# Altium footprint library Connector.PcbLib: 82 footprints (part 4 of 6)
Each footprint in its own frame and in the unit in brackets; x right, y up, seen from the top. Pads: shape width x height; smd on the part's side, far side on the other; paste and mask are expansions set on the pad; w line width, h text height; cw(c..) or ccw(c..) is an arc to the next point about the centre after c.
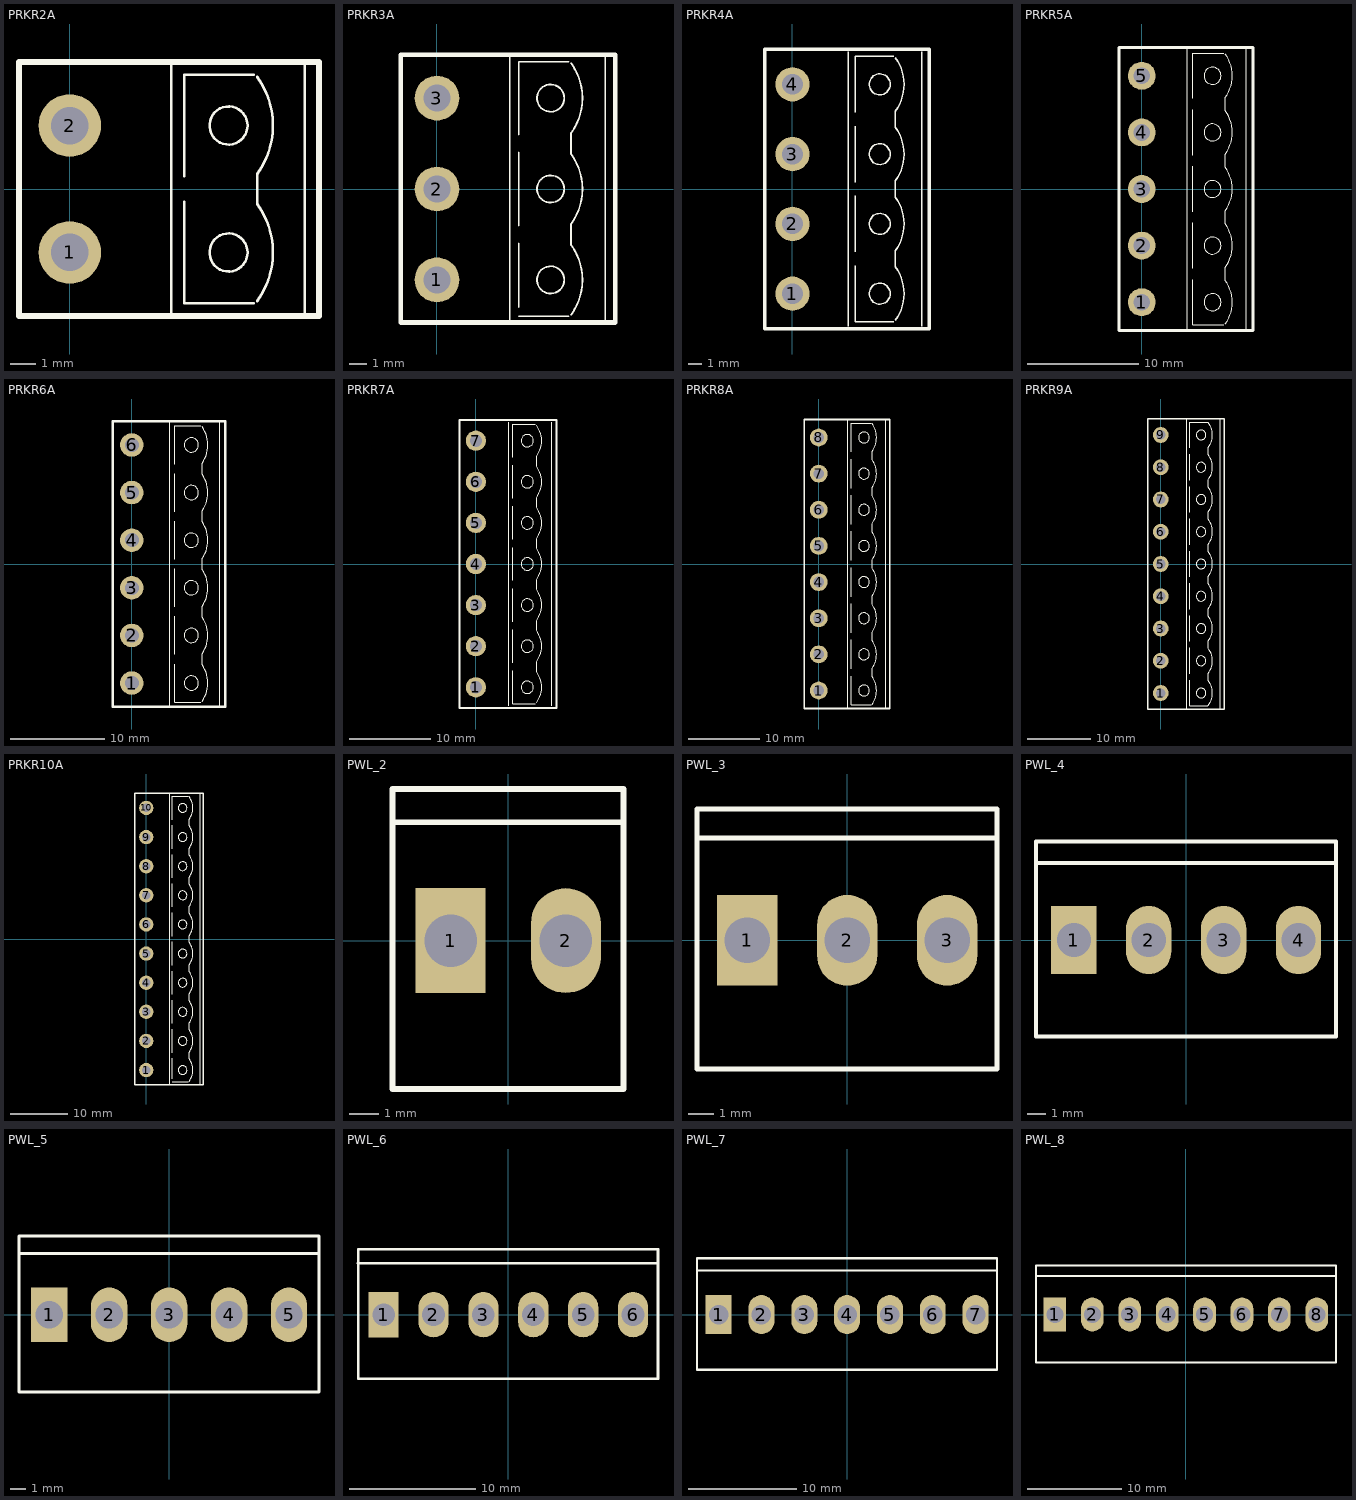
[diagram p3: the footprints below, top view; thin cyan lines are the x and y axes]

## PRKR2A [mm]
height 1.2
pads (2):
  round 2.5 hole 1.5: 1(0,-2.54) 2(0,2.54)
Top Overlay:
  circle w0.102: c6.35,2.54 r0.762
  circle w0.102: c6.35,-2.54 r0.762
  lines w0.102: 4.064,-5.08 4.064,5.08 ; 4.572,-0.508 4.572,-4.572 7.366,-4.572 ; 4.572,0.508 4.572,4.572 7.366,4.572 ; 7.496,-4.482 ccw(c4.826,-2.54) 7.496,-0.598 7.496,0.598 ccw(c4.826,2.54) 7.496,4.482 ; 9.398,-5.08 9.398,5.08
  lines w0.254: -2.032,-5.08 -2.032,5.08 9.97,5.08 9.97,-5.08 -2.032,-5.08
3D body "User Library-MSTB 2,5-2-G-5,08 1770711_mstb_2.5-2-g-5.08-la.STEP": height 8.67, standoff -3.43, extent -2.032,-5.08 9.97,5.08

## PRKR3A [mm]
pads (3):
  round 2.5 hole 1.5: 1(0,-5.08) 2(0,0) 3(0,5.08)
Top Overlay:
  circle w0.102: c6.35,-5.08 r0.762
  circle w0.102: c6.35,0 r0.762
  circle w0.102: c6.35,5.08 r0.762
  lines w0.102: 4.064,-7.46 4.064,7.5 ; 4.572,-7.112 7.366,-7.112 ; 4.572,-6.604 4.572,-3.048 ; 4.572,-2.032 4.572,2.032 ; 4.572,3.048 4.572,7.112 7.366,7.112 ; 7.496,-7.022 ccw(c4.826,-5.08) 7.496,-3.138 7.496,-1.942 ccw(c4.826,0) 7.496,1.942 7.496,3.138 ccw(c4.826,5.08) 7.496,7.022 ; 9.398,-7.46 9.398,7.5
  lines w0.254: -2.032,-7.46 -2.032,7.5 9.968,7.5 9.968,-7.46 -2.032,-7.46
3D body "User Library-MSTB 2,5-3-G 1754452_mstb_2.5-3-g.STEP": height 8.67, standoff -3.43, extent -2.032,-7.5 9.968,7.5

## PRKR4A [mm]
height 1.2
pads (4):
  round 2.5 hole 1.5: 1(0,-7.62) 2(0,-2.54) 3(0,2.54) 4(0,7.62)
Top Overlay:
  circle w0.102: c6.35,7.62 r0.762
  circle w0.102: c6.35,2.54 r0.762
  circle w0.102: c6.35,-2.54 r0.762
  circle w0.102: c6.35,-7.62 r0.762
  lines w0.102: 4.064,-10 4.064,10 ; 4.572,-5.588 4.572,-9.652 7.366,-9.652 ; 4.572,-4.572 4.572,-0.508 ; 4.572,0.508 4.572,4.572 ; 4.572,5.588 4.572,9.652 7.366,9.652 ; 7.496,-9.562 ccw(c4.826,-7.62) 7.496,-5.678 7.496,-4.482 ccw(c4.826,-2.54) 7.496,-0.598 7.496,0.598 ccw(c4.826,2.54) 7.496,4.482 7.496,5.678 ccw(c4.826,7.62) 7.496,9.562 ; 9.398,-10 9.398,10
  lines w0.254: -2.032,-10.16 -2.032,10.16 9.97,10.16 9.97,-10.16 -2.032,-10.16
3D body "User Library-MSTB 2,5-4-G-5,08 1759033_mstb_2.5-4-g-5.08.STEP": height 8.67, standoff -3.43, extent -2.032,-10.16 9.97,10.16

## PRKR5A [mm]
height 1.2
pads (5):
  round 2.5 hole 1.5: 1(0,-10.16) 2(0,-5.08) 3(0,0) 4(0,5.08) 5(0,10.16)
Top Overlay:
  circle w0.102: c6.35,5.08 r0.762
  circle w0.102: c6.35,0 r0.762
  circle w0.102: c6.35,-5.08 r0.762
  circle w0.102: c6.35,-10.16 r0.762
  circle w0.102: c6.35,10.16 r0.762
  lines w0.102: 4.064,-12.54 4.064,12.7 ; 4.572,-8.128 4.572,-12.192 7.366,-12.192 ; 4.572,-7.112 4.572,-3.048 ; 4.572,-2.032 4.572,2.032 ; 4.572,3.048 4.572,7.112 ; 4.572,8.128 4.572,12.192 7.366,12.192 ; 7.496,-12.102 ccw(c4.826,-10.16) 7.496,-8.218 7.496,-7.022 ccw(c4.826,-5.08) 7.496,-3.138 7.496,-1.942 ccw(c4.826,0) 7.496,1.942 7.496,3.138 ccw(c4.826,5.08) 7.496,7.022 7.496,8.218 ccw(c4.826,10.16) 7.496,12.102 ; 9.398,-12.54 9.398,12.7
  lines w0.254: -2.032,-12.7 -2.032,12.7 9.97,12.7 9.97,-12.7 -2.032,-12.7
3D body "User Library-MSTB 2,5-5-G-5,08 1759046_mstb_2.5-5-g-5.08.STEP": height 8.67, standoff -3.43, extent -2.032,-12.7 9.97,12.7

## PRKR6A [mm]
height 1.2
pads (6):
  round 2.5 hole 1.5: 1(0,-12.7) 2(0,-7.62) 3(0,-2.54) 4(0,2.54) 5(0,7.62) 6(0,12.7)
Top Overlay:
  circle w0.102: c6.35,7.62 r0.762
  circle w0.102: c6.35,2.54 r0.762
  circle w0.102: c6.35,-2.54 r0.762
  circle w0.102: c6.35,-7.62 r0.762
  circle w0.102: c6.35,-12.7 r0.762
  circle w0.102: c6.35,12.7 r0.762
  lines w0.102: 4.064,-15.24 4.064,15.24 ; 4.572,-10.668 4.572,-14.732 7.366,-14.732 ; 4.572,-9.652 4.572,-5.588 ; 4.572,-4.572 4.572,-0.508 ; 4.572,0.508 4.572,4.572 ; 4.572,5.588 4.572,9.652 ; 4.572,10.668 4.572,14.732 7.366,14.732 ; 7.496,-14.642 ccw(c4.826,-12.7) 7.496,-10.758 7.496,-9.562 ccw(c4.826,-7.62) 7.496,-5.678 7.496,-4.482 ccw(c4.826,-2.54) 7.496,-0.598 7.496,0.598 ccw(c4.826,2.54) 7.496,4.482 7.496,5.678 ccw(c4.826,7.62) 7.496,9.562 7.496,10.758 ccw(c4.826,12.7) 7.496,14.642 ; 9.398,-15.24 9.398,15.24
  lines w0.254: -2.032,-15.24 9.97,-15.24 9.97,15.24 -2.032,15.24 -2.032,-15.24
3D body "User Library-MSTB 2,5-6-G-5,08 1759059_mstb_2.5-6-g-5.08.STEP": height 8.67, standoff -3.43, extent -2.032,-15.24 9.97,15.24

## PRKR7A [mm]
height 1.2
pads (7):
  round 2.5 hole 1.5: 1(0,-15.24) 2(0,-10.16) 3(0,-5.08) 4(0,0) 5(0,5.08) 6(0,10.16) 7(0,15.24)
Top Overlay:
  circle w0.102: c6.35,10.16 r0.762
  circle w0.102: c6.35,-10.16 r0.762
  circle w0.102: c6.35,-5.08 r0.762
  circle w0.102: c6.35,0 r0.762
  circle w0.102: c6.35,5.08 r0.762
  circle w0.102: c6.35,15.24 r0.762
  circle w0.102: c6.35,-15.24 r0.762
  lines w0.102: 4.064,-17.5 4.064,17.5 ; 4.572,-13.208 4.572,-17.272 7.366,-17.272 ; 4.572,-12.192 4.572,-8.128 ; 4.572,-7.112 4.572,-3.048 ; 4.572,-2.032 4.572,2.032 ; 4.572,3.048 4.572,7.112 ; 4.572,8.128 4.572,12.192 ; 4.572,13.208 4.572,17.272 7.366,17.272 ; 7.496,-17.182 ccw(c4.826,-15.24) 7.496,-13.298 7.496,-12.102 ccw(c4.826,-10.16) 7.496,-8.218 7.496,-7.022 ccw(c4.826,-5.08) 7.496,-3.138 7.496,-1.942 ccw(c4.826,0) 7.496,1.942 7.496,3.138 ccw(c4.826,5.08) 7.496,7.022 7.496,8.218 ccw(c4.826,10.16) 7.496,12.102 7.496,13.298 ccw(c4.826,15.24) 7.496,17.182 ; 9.398,-17.5 9.398,17.5
  lines w0.254: -2.032,-17.78 9.97,-17.78 9.97,17.78 -2.032,17.78 -2.032,-17.78
3D body "User Library-MSTB 2,5-7-G-5,08 1759062_mstb_2.5-7-g-5.08.STEP": height 8.67, standoff -3.43, extent -2.032,-17.78 9.97,17.78

## PRKR8A [mm]
height 1.2
pads (8):
  round 2.5 hole 1.5: 1(0,-17.78) 2(0,-12.7) 3(0,-7.62) 4(0,-2.54) 5(0,2.54) 6(0,7.62) 7(0,12.7) 8(0,17.78)
Top Overlay:
  circle w0.102: c6.35,7.62 r0.762
  circle w0.102: c6.35,2.54 r0.762
  circle w0.102: c6.35,-2.54 r0.762
  circle w0.102: c6.35,-7.62 r0.762
  circle w0.102: c6.35,-12.7 r0.762
  circle w0.102: c6.35,12.7 r0.762
  circle w0.102: c6.35,17.78 r0.762
  circle w0.102: c6.35,-17.78 r0.762
  lines w0.102: 4.064,-20.32 4.064,20.32 ; 4.572,-15.748 4.572,-19.812 7.366,-19.812 ; 4.572,-14.732 4.572,-10.668 ; 4.572,-9.652 4.572,-5.588 ; 4.572,-4.572 4.572,-0.508 ; 4.572,0.508 4.572,4.572 ; 4.572,5.588 4.572,9.652 ; 4.572,10.668 4.572,14.732 ; 4.572,15.748 4.572,19.812 7.366,19.812 ; 7.496,-19.722 ccw(c4.826,-17.78) 7.496,-15.838 7.496,-14.642 ccw(c4.826,-12.7) 7.496,-10.758 7.496,-9.562 ccw(c4.826,-7.62) 7.496,-5.678 7.496,-4.482 ccw(c4.826,-2.54) 7.496,-0.598 7.496,0.598 ccw(c4.826,2.54) 7.496,4.482 7.496,5.678 ccw(c4.826,7.62) 7.496,9.562 7.496,10.758 ccw(c4.826,12.7) 7.496,14.642 7.496,15.838 ccw(c4.826,17.78) 7.496,19.722 ; 9.398,-20.32 9.398,20.32
  lines w0.254: -2.032,-20.32 9.97,-20.32 9.97,20.32 -2.032,20.32 -2.032,-20.32
3D body "User Library-MSTB 2,5-8-G-5,08 1759075_mstb_2.5-8-g-5.08.STEP": height 8.67, standoff -3.43, extent -2.032,-20.32 9.97,20.32

## PRKR9A [mm]
height 1.2
pads (9):
  round 2.5 hole 1.5: 1(0,-20.32) 2(0,-15.24) 3(0,-10.16) 4(0,-5.08) 5(0,0) 6(0,5.08) 7(0,10.16) 8(0,15.24) 9(0,20.32)
Top Overlay:
  circle w0.102: c6.35,10.16 r0.762
  circle w0.102: c6.35,-10.16 r0.762
  circle w0.102: c6.35,-5.08 r0.762
  circle w0.102: c6.35,0 r0.762
  circle w0.102: c6.35,5.08 r0.762
  circle w0.102: c6.35,15.24 r0.762
  circle w0.102: c6.35,-15.24 r0.762
  circle w0.102: c6.35,-20.32 r0.762
  circle w0.102: c6.35,20.32 r0.762
  lines w0.102: 4.064,-22.86 4.064,22.86 ; 4.572,-18.288 4.572,-22.352 7.366,-22.352 ; 4.572,-17.272 4.572,-13.208 ; 4.572,-12.192 4.572,-8.128 ; 4.572,-7.112 4.572,-3.048 ; 4.572,-2.032 4.572,2.032 ; 4.572,3.048 4.572,7.112 ; 4.572,8.128 4.572,12.192 ; 4.572,13.208 4.572,17.272 ; 4.572,18.288 4.572,22.352 7.366,22.352 ; 7.496,-22.262 ccw(c4.826,-20.32) 7.496,-18.378 7.496,-17.182 ccw(c4.826,-15.24) 7.496,-13.298 7.496,-12.102 ccw(c4.826,-10.16) 7.496,-8.218 7.496,-7.022 ccw(c4.826,-5.08) 7.496,-3.138 7.496,-1.942 ccw(c4.826,0) 7.496,1.942 7.496,3.138 ccw(c4.826,5.08) 7.496,7.022 7.496,8.218 ccw(c4.826,10.16) 7.496,12.102 7.496,13.298 ccw(c4.826,15.24) 7.496,17.182 7.496,18.378 ccw(c4.826,20.32) 7.496,22.262 ; 9.398,-22.86 9.398,22.86
  lines w0.254: -2.032,-22.86 9.97,-22.86 9.97,22.86 -2.032,22.86 -2.032,-22.86
3D body "User Library-MSTB 2,5-9-G-5,08 1759088_mstb_2.5-9-g-5.08.STEP": height 8.67, standoff -3.43, extent -2.032,-22.86 9.97,22.86

## PRKR10A [mm]
pads (10):
  round 2.5 hole 1.5: 1(0,-22.86) 2(0,-17.78) 3(0,-12.7) 4(0,-7.62) 5(0,-2.54) 6(0,2.54) 7(0,7.62) 8(0,12.7) 9(0,17.78) 10(0,22.86)
Top Overlay:
  circle w0.102: c6.35,7.62 r0.762
  circle w0.102: c6.35,2.54 r0.762
  circle w0.102: c6.35,-2.54 r0.762
  circle w0.102: c6.35,-7.62 r0.762
  circle w0.102: c6.35,12.7 r0.762
  circle w0.102: c6.35,17.78 r0.762
  circle w0.102: c6.35,-12.7 r0.762
  circle w0.102: c6.35,-17.78 r0.762
  circle w0.102: c6.35,22.86 r0.762
  circle w0.102: c6.35,-22.86 r0.762
  lines w0.102: 4.064,-25.4 4.064,25.4 ; 4.572,-24.892 7.366,-24.892 ; 4.572,-24.384 4.572,-20.828 ; 4.572,-19.812 4.572,-15.748 ; 4.572,-14.732 4.572,-10.668 ; 4.572,-9.652 4.572,-5.588 ; 4.572,-4.572 4.572,-1.016 ; 4.572,-4.064 4.572,-0.508 ; 4.572,0.508 4.572,4.064 ; 4.572,1.016 4.572,4.572 ; 4.572,5.588 4.572,9.652 ; 4.572,10.668 4.572,14.732 ; 4.572,15.748 4.572,19.812 ; 4.572,20.828 4.572,24.892 7.366,24.892 ; 7.496,-24.802 ccw(c4.826,-22.86) 7.496,-20.918 7.496,-19.722 ccw(c4.826,-17.78) 7.496,-15.838 7.496,-14.642 ccw(c4.826,-12.7) 7.496,-10.758 7.496,-9.562 ccw(c4.826,-7.62) 7.496,-5.678 7.496,-4.482 ccw(c4.826,-2.54) 7.496,-0.598 7.496,0.598 ccw(c4.826,2.54) 7.496,4.482 7.496,5.678 ccw(c4.826,7.62) 7.496,9.562 7.496,10.758 ccw(c4.826,12.7) 7.496,14.642 7.496,15.838 ccw(c4.826,17.78) 7.496,19.722 7.496,20.918 ccw(c4.826,22.86) 7.496,24.802 ; 9.398,-25.4 9.398,25.4
  lines w0.254: 9.968,-25.4 9.968,25.4 ; 9.97,-25.4 -2.032,-25.4 -2.032,25.4 9.97,25.4
3D body "User Library-MSTB 2,5-10-G-5,08 1759091_mstb_2.5-10-g-5.08.STEP": height 8.67, standoff -3.43, extent -2.032,-25.4 9.97,25.4

## PWL_2 [mm] "Connector; Header; 2 Position"
height 0.001
pads (2):
  rect 2.4x3.6 hole 1.8: 1(-1.98,0)
  oval 2.4x3.6 hole 1.8: 2(1.98,0)
Top Overlay:
  lines w0.2: -3.98,4.064 3.96,4.064 ; -3.98,-5.1 3.96,-5.1 3.96,5.207 -3.98,5.207 -3.98,-5.1
3D body "PWL-2.stp": height 13.5, standoff -4, extent -3.96,-5 3.96,5

## PWL_3 [mm] "Connector; Header; 3 Position"
height 0.001
pads (3):
  rect 2.4x3.6 hole 1.8: 1(-3.96,0)
  oval 2.4x3.6 hole 1.8: 2(0,0) 3(3.96,0)
Top Overlay:
  lines w0.2: -5.96,4.064 5.94,4.064 ; -5.96,-5.1 -5.96,5.207 5.94,5.207 5.94,-5.1 -5.96,-5.1
3D body "PWL-3.stp": height 13.5, standoff -4, extent -5.94,-5 5.94,5

## PWL_4 [mm] "Connector; Header; 4 Position"
height 0.001
pads (4):
  rect 2.4x3.6 hole 1.8: 1(-5.94,0)
  oval 2.4x3.6 hole 1.8: 2(-1.98,0) 3(1.98,0) 4(5.94,0)
Top Overlay:
  lines w0.2: -7.94,4.064 7.92,4.064 ; -7.94,-5.1 -7.94,5.207 7.92,5.207 7.92,-5.1 -7.94,-5.1
3D body "PWL-4.stp": height 13.5, standoff -4, extent -7.92,-5 7.92,5

## PWL_5 [mm] "Connector; Header; 5 Position"
height 0.001
pads (5):
  rect 2.4x3.6 hole 1.8: 1(-7.92,0)
  oval 2.4x3.6 hole 1.8: 2(-3.96,0) 3(0,0) 4(3.96,0) 5(7.92,0)
Top Overlay:
  lines w0.2: -9.92,4.064 9.9,4.064 ; -9.92,-5.1 -9.92,5.207 9.9,5.207 9.9,-5.1 -9.92,-5.1
3D body "PWL-5.stp": height 13.5, standoff -4, extent -9.9,-5 9.9,5

## PWL_6 [mm] "Connector; Header; 6 Position"
height 0.001
pads (6):
  rect 2.4x3.6 hole 1.8: 1(-9.9,0)
  oval 2.4x3.6 hole 1.8: 2(-5.94,0) 3(-1.98,0) 4(1.98,0) 5(5.94,0) 6(9.9,0)
Top Overlay:
  lines w0.2: -11.932,4.064 11.88,4.064 ; -11.9,-5.1 -11.9,5.207 11.88,5.207 11.88,-5.1 -11.9,-5.1
3D body "PWL-6.stp": height 13.5, standoff -4, extent -11.88,-5 11.88,5

## PWL_7 [mm] "Connector; Header; 7 Position"
height 0.001
pads (7):
  rect 2.4x3.6 hole 1.8: 1(-11.88,0)
  oval 2.4x3.6 hole 1.8: 2(-7.92,0) 3(-3.96,0) 4(0,0) 5(3.96,0) 6(7.92,0) 7(11.88,0)
Top Overlay:
  lines w0.2: -13.88,4.064 13.86,4.064 ; -13.88,-5.1 -13.88,5.207 13.86,5.207 13.86,-5.1 -13.88,-5.1
3D body "PWL-7.stp": height 13.5, standoff -4, extent -13.86,-5 13.86,5

## PWL_8 [mm] "Connector; Header; 8 Position"
height 0.001
pads (8):
  rect 2.4x3.6 hole 1.8: 1(-13.86,0)
  oval 2.4x3.6 hole 1.8: 2(-9.9,0) 3(-5.94,0) 4(-1.98,0) 5(1.98,0) 6(5.94,0) 7(9.9,0) 8(13.86,0)
Top Overlay:
  lines w0.2: -15.86,4.064 15.89,4.064 ; -15.86,-5.1 15.89,-5.1 15.89,5.207 -15.86,5.207 -15.86,-5.1
3D body "PWL-8.stp": height 13.5, standoff -4, extent -15.822,-4.92 15.858,5.08